# Altium footprint library Mech.PcbLib: 75 footprints (part 3 of 5)
Each footprint in its own frame and in the unit in brackets; x right, y up, seen from the top. Pads: shape width x height; smd on the part's side, far side on the other; paste and mask are expansions set on the pad; w line width, h text height; cw(c..) or ccw(c..) is an arc to the next point about the centre after c.
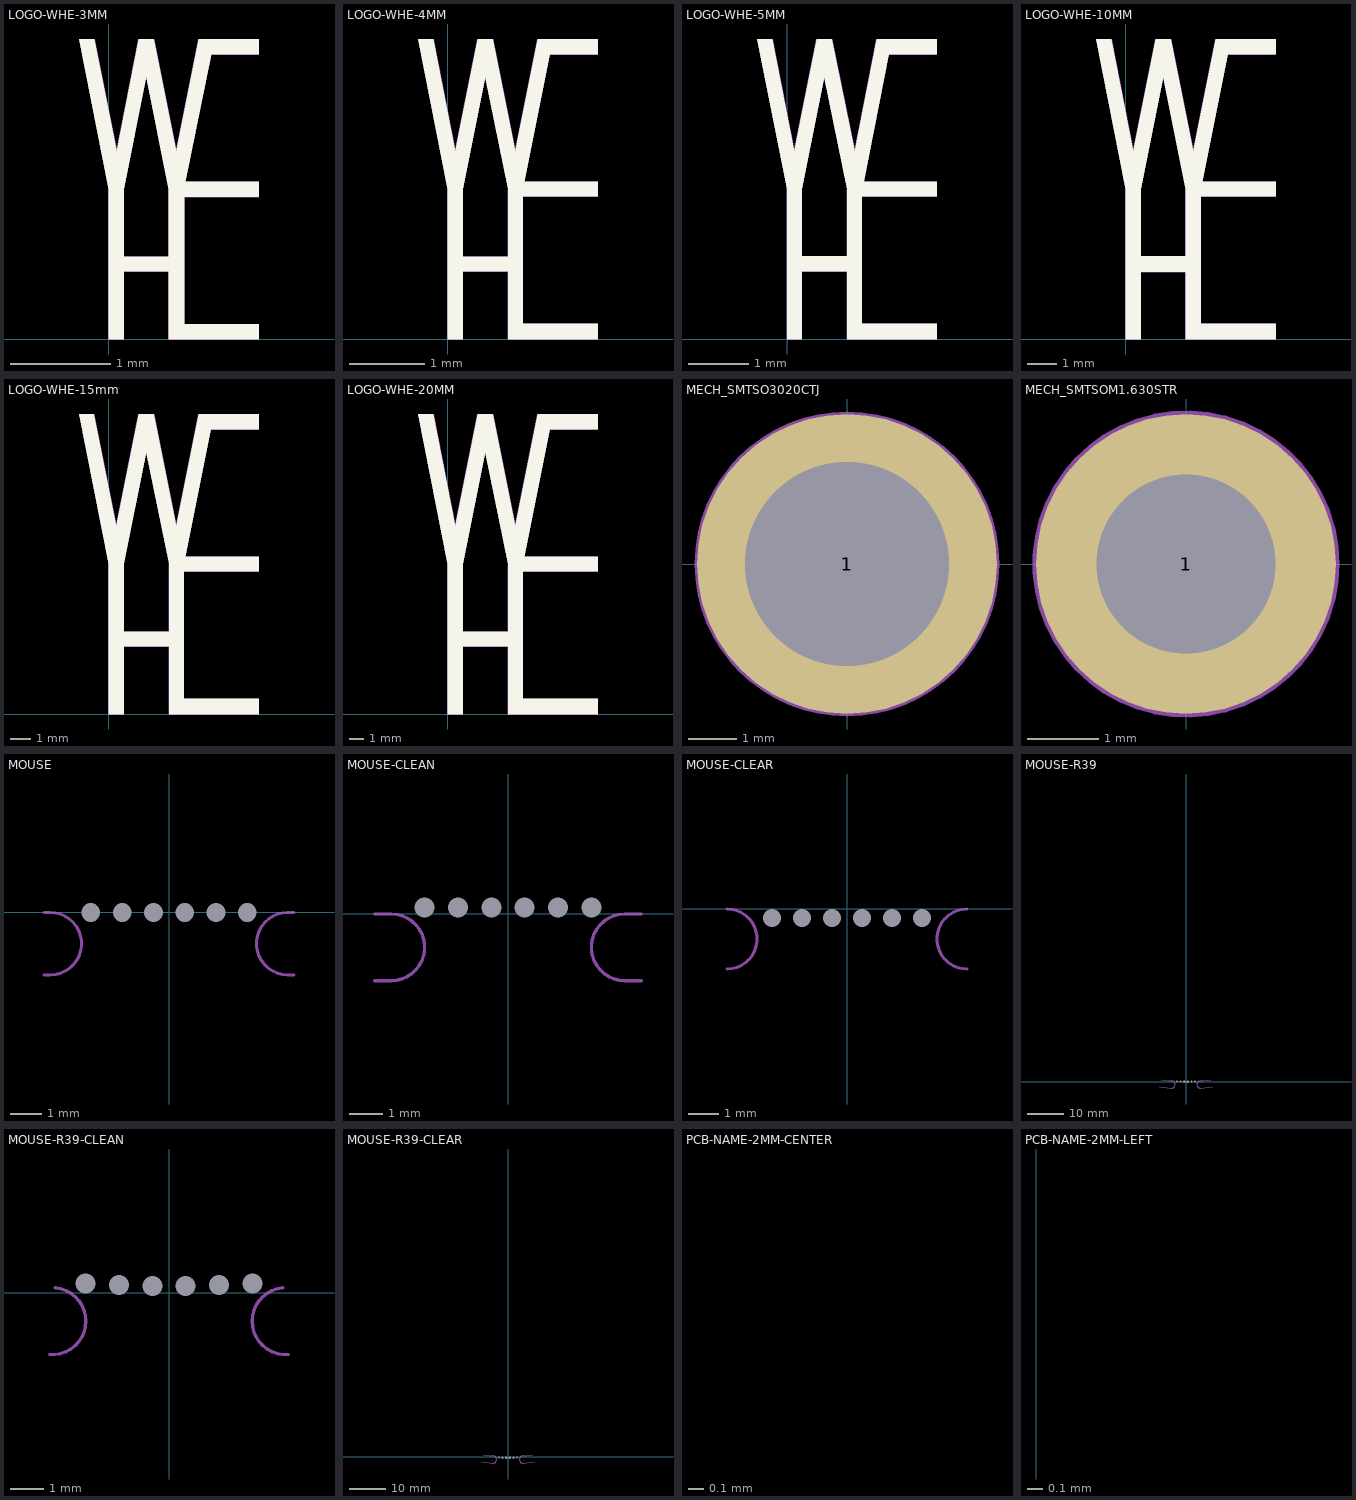
[diagram p2: the footprints below, top view; thin cyan lines are the x and y axes]

## LOGO-WHE-3MM [mm]
Top Overlay:
  region: -0.3,2.997 0,1.499 0.15,1.499 0.375,2.622 0.599,1.499 0.599,0.824 0.15,0.824 0.15,1.499 0,1.499 0,0 0.15,0 0.15,0.674 0.599,0.674 0.599,0 1.499,0 1.499,0.15 0.749,0.15 0.749,1.424 1.499,1.424 1.499,1.573 0.764,1.573 1.019,2.847 1.499,2.847 1.499,2.997 0.899,2.997 0.674,1.873 0.45,2.997 0.3,2.997 0.075,1.873 -0.15,2.997
Top Assembly:
  lines w0.007: 0,1.499 0,0 0.15,0 0.15,0.674 0.599,0.674 0.599,0 0.749,0 1.499,0 1.499,0.15 0.749,0.15 0.749,1.424 1.499,1.424 1.499,1.573 0.764,1.573 1.019,2.847 1.499,2.847 1.499,2.997 1.049,2.997 0.899,2.997 0.674,1.873 0.45,2.997 0.3,2.997 0.075,1.873 -0.15,2.997 -0.3,2.997 0,1.499 ; 0,1.499 0.15,1.499 ; 0.15,1.499 0.15,0.824 0.599,0.824 0.599,1.499 0.375,2.622 0.15,1.499

## LOGO-WHE-4MM [mm]
Top Overlay:
  region: -0.4,4 0,2 0.2,2 0.5,3.5 0.8,2 0.8,1.1 0.2,1.1 0.2,2 0,2 0,0 0.2,0 0.2,0.9 0.8,0.9 0.8,0 2,0 2,0.2 1,0.2 1,1.9 2,1.9 2,2.1 1.02,2.1 1.36,3.8 2,3.8 2,4 1.2,4 0.9,2.5 0.6,4 0.4,4 0.1,2.5 -0.2,4
Top Assembly:
  lines w0.01: 0,2 0,0 0.2,0 0.2,0.9 0.8,0.9 0.8,0 1,0 2,0 2,0.2 1,0.2 1,1.9 2,1.9 2,2.1 1.02,2.1 1.36,3.8 2,3.8 2,4 1.4,4 1.2,4 0.9,2.5 0.6,4 0.4,4 0.1,2.5 -0.2,4 -0.4,4 0,2 ; 0,2 0.2,2 ; 0.2,2 0.2,1.1 0.8,1.1 0.8,2 0.5,3.5 0.2,2

## LOGO-WHE-5MM [mm]
Top Overlay:
  region: -0.5,5 0,2.5 0.25,2.5 0.625,4.375 1,2.5 1,1.375 0.25,1.375 0.25,2.5 0,2.5 0,0 0.25,0 0.25,1.125 1,1.125 1,0 2.5,0 2.5,0.25 1.25,0.25 1.25,2.375 2.5,2.375 2.5,2.625 1.275,2.625 1.7,4.75 2.5,4.75 2.5,5 1.5,5 1.125,3.125 0.75,5 0.5,5 0.125,3.125 -0.25,5
Top Assembly:
  lines w0.012: 0,2.5 0,0 0.25,0 0.25,1.125 1,1.125 1,0 1.25,0 2.5,0 2.5,0.25 1.25,0.25 1.25,2.375 2.5,2.375 2.5,2.625 1.275,2.625 1.7,4.75 2.5,4.75 2.5,5 1.75,5 1.5,5 1.125,3.125 0.75,5 0.5,5 0.125,3.125 -0.25,5 -0.5,5 0,2.5 ; 0,2.5 0.25,2.5 ; 0.25,2.5 0.25,1.375 1,1.375 1,2.5 0.625,4.375 0.25,2.5

## LOGO-WHE-10MM [mm]
Top Overlay:
  region: -1,10 0,5 0.5,5 1.25,8.75 2,5 2,2.75 0.5,2.75 0.5,5 0,5 0,0 0.5,0 0.5,2.25 2,2.25 2,0 5,0 5,0.5 2.5,0.5 2.5,4.75 5,4.75 5,5.25 2.55,5.25 3.4,9.5 5,9.5 5,10 3,10 2.25,6.25 1.5,10 1,10 0.25,6.25 -0.5,10
Top Assembly:
  lines w0.025: 0,5 0,0 0.5,0 0.5,2.25 2,2.25 2,0 2.5,0 5,0 5,0.5 2.5,0.5 2.5,4.75 5,4.75 5,5.25 2.55,5.25 3.4,9.5 5,9.5 5,10 3.5,10 3,10 2.25,6.25 1.5,10 1,10 0.25,6.25 -0.5,10 -1,10 0,5 ; 0,5 0.5,5 ; 0.5,5 0.5,2.75 2,2.75 2,5 1.25,8.75 0.5,5

## LOGO-WHE-15mm [mm]
Top Overlay:
  region: -1.5,15 0,7.5 0.75,7.5 1.875,13.125 3,7.5 3,4.125 0.75,4.125 0.75,7.5 0,7.5 0,0 0.75,0 0.75,3.375 3,3.375 3,0 7.5,0 7.5,0.75 3.75,0.75 3.75,7.125 7.5,7.125 7.5,7.875 3.825,7.875 5.1,14.25 7.5,14.25 7.5,15 4.5,15 3.375,9.375 2.25,15 1.5,15 0.375,9.375 -0.75,15
Top Assembly:
  lines w0.038: 0,7.5 0,0 0.75,0 0.75,3.375 3,3.375 3,0 3.75,0 7.5,0 7.5,0.75 3.75,0.75 3.75,7.125 7.5,7.125 7.5,7.875 3.825,7.875 5.1,14.25 7.5,14.25 7.5,15 5.25,15 4.5,15 3.375,9.375 2.25,15 1.5,15 0.375,9.375 -0.75,15 -1.5,15 0,7.5 ; 0,7.5 0.75,7.5 ; 0.75,7.5 0.75,4.125 3,4.125 3,7.5 1.875,13.125 0.75,7.5

## LOGO-WHE-20MM [mm]
Top Overlay:
  region: -2,20 0,10 1,10 2.5,17.5 4,10 4,5.5 1,5.5 1,10 0,10 0,0 1,0 1,4.5 4,4.5 4,0 10,0 10,1 5,1 5,9.5 10,9.5 10,10.5 5.1,10.5 6.8,19 10,19 10,20 6,20 4.5,12.5 3,20 2,20 0.5,12.5 -1,20
Top Assembly:
  lines w0.05: 0,10 0,0 1,0 1,4.5 4,4.5 4,0 5,0 10,0 10,1 5,1 5,9.5 10,9.5 10,10.5 5.1,10.5 6.8,19 10,19 10,20 7,20 6,20 4.5,12.5 3,20 2,20 0.5,12.5 -1,20 -2,20 0,10 ; 0,10 1,10 ; 1,10 1,5.5 4,5.5 4,10 2.5,17.5 1,10

## MECH_SMTSO3020CTJ [mm] "SMTSO M3x0.5, 2mm Solder Nut"
pads (1):
  round 6.2 / inner round 5.2 / far side round 5.2 hole 4.22: 1(0,0)
Top Assembly:
  circle w0.1: c0,0 r3.1
Bottom Assembly (Mech12):
  circle w0.1: c0,0 r2.6
3D body "SMTSO3020CTJ.stp": height 2, standoff -0.76, extent -2.768,-2.78 2.768,2.78

## MECH_SMTSOM1.630STR [mm] "SMTSO M1.6x0.35, 3mm Solder Nut"
pads (1):
  round 4.2 / inner round 3.5 / far side round 3.5 hole 2.5: 1(0,0)
Top Assembly:
  circle w0.1: c0,0 r2.1
Bottom Assembly (Mech12):
  circle w0.1: c0,0 r1.75
3D body "SMTSOM1.630STR.stp": height 3, standoff -0.48, extent -1.836,-1.59 1.836,1.59

## MOUSE [mm] "Mouse-bites / Holes on board outline"
pads (6):
  round 0 hole 0.6 unplated: 0(-2.5,0) 0(-1.5,0) 0(-0.5,0) 0(0.5,0) 0(1.5,0) 0(2.5,0)
Board:
  lines w0.1: -4,-2 -3.8,-2 ccw(c-3.8,-1) -3.8,0 -4,0 ; 4,-2 3.8,-2 cw(c3.8,-1) 3.8,0 4,0

## MOUSE-CLEAN [mm] "Mouse-bites / Holes moved inside to get a clean breakaway area"
pads (6):
  round 0 hole 0.6 unplated: 0(-2.5,0.2) 0(-1.5,0.2) 0(-0.5,0.2) 0(0.5,0.2) 0(1.5,0.2) 0(2.5,0.2)
Board:
  lines w0.1: -4,-2 -3.5,-2 ccw(c-3.5,-1) -3.5,0 -4,0 ; 4,-2 3.5,-2 cw(c3.5,-1) 3.5,0 4,0

## MOUSE-CLEAR [mm] "Mouse-bites / Holes moved outside to avoid collisions with tracks on PCB"
pads (6):
  round 0 hole 0.6 unplated: 0(-2.5,-0.3) 0(-1.5,-0.3) 0(-0.5,-0.3) 0(0.5,-0.3) 0(1.5,-0.3) 0(2.5,-0.3)
Board:
  lines w0.1: -4,-2 ccw(c-4,-1) -4,0 ; 4,-2 cw(c4,-1) 4,0

## MOUSE-R39 [mm] "Mouse-bites on a radius of 39mm / Holes on board outline"
pads (6):
  round 0 hole 0.6 unplated: 0(-2.5,0.08) 0(-1.501,0.029) 0(-0.5,0.003) 0(0.5,0.003) 0(1.501,0.029) 0(2.5,0.08)
Board:
  lines w0.1: -7.12,-1.377 ccw(c0,39) -4.072,-1.797 ccw(c-3.973,-0.802) -3.873,0.193 cw(c0,39) -6.772,0.592 ; 6.772,0.592 cw(c0,39) 3.873,0.193 ccw(c3.973,-0.802) 4.072,-1.797 ccw(c0,39) 7.12,-1.377

## MOUSE-R39-CLEAN [mm] "Mouse-bites on a radius of 39mm / Holes moved inside to get a clean breakaway area"
pads (6):
  round 0 hole 0.6 unplated: 0(-2.497,0.28) 0(-1.499,0.229) 0(-0.5,0.203) 0(0.5,0.203) 0(1.499,0.229) 0(2.497,0.28)
Board:
  lines w0.1: -3.574,-1.844 ccw(c-3.487,-0.848) -3.4,0.148 ; 3.4,0.148 ccw(c3.487,-0.848) 3.574,-1.844

## MOUSE-R39-CLEAR [mm] "Mouse-bites on a radius of 39mm / Holes moved outside to avoid collisions with tracks on PCB"
pads (6):
  round 0 hole 0.6 unplated: 0(-2.498,-0.22) 0(-1.5,-0.271) 0(-0.5,-0.297) 0(0.5,-0.297) 0(1.5,-0.271) 0(2.498,-0.22)
Board:
  lines w0.1: -7.12,-1.377 ccw(c0,39) -4.214,-1.783 ccw(c-4.112,-0.788) -4.006,0.206 cw(c0,39) -6.772,0.592 ; 6.772,0.592 cw(c0,39) 4.006,0.206 ccw(c4.112,-0.788) 4.214,-1.783 ccw(c0,39) 7.12,-1.377

## PCB-NAME-2MM-CENTER [mm]
Top Overlay:
  text "'.PCB_NAME''.Index_Main'" at -10.646,0.355 h2

## PCB-NAME-2MM-LEFT [mm]
Top Overlay:
  text "'.PCB_NAME''.Index_Main'" at 0,0.355 h2